# Altium schematic symbol library 1.4 - 74系列TTL芯片.SchLib: 650 symbols (part 7 of 7)
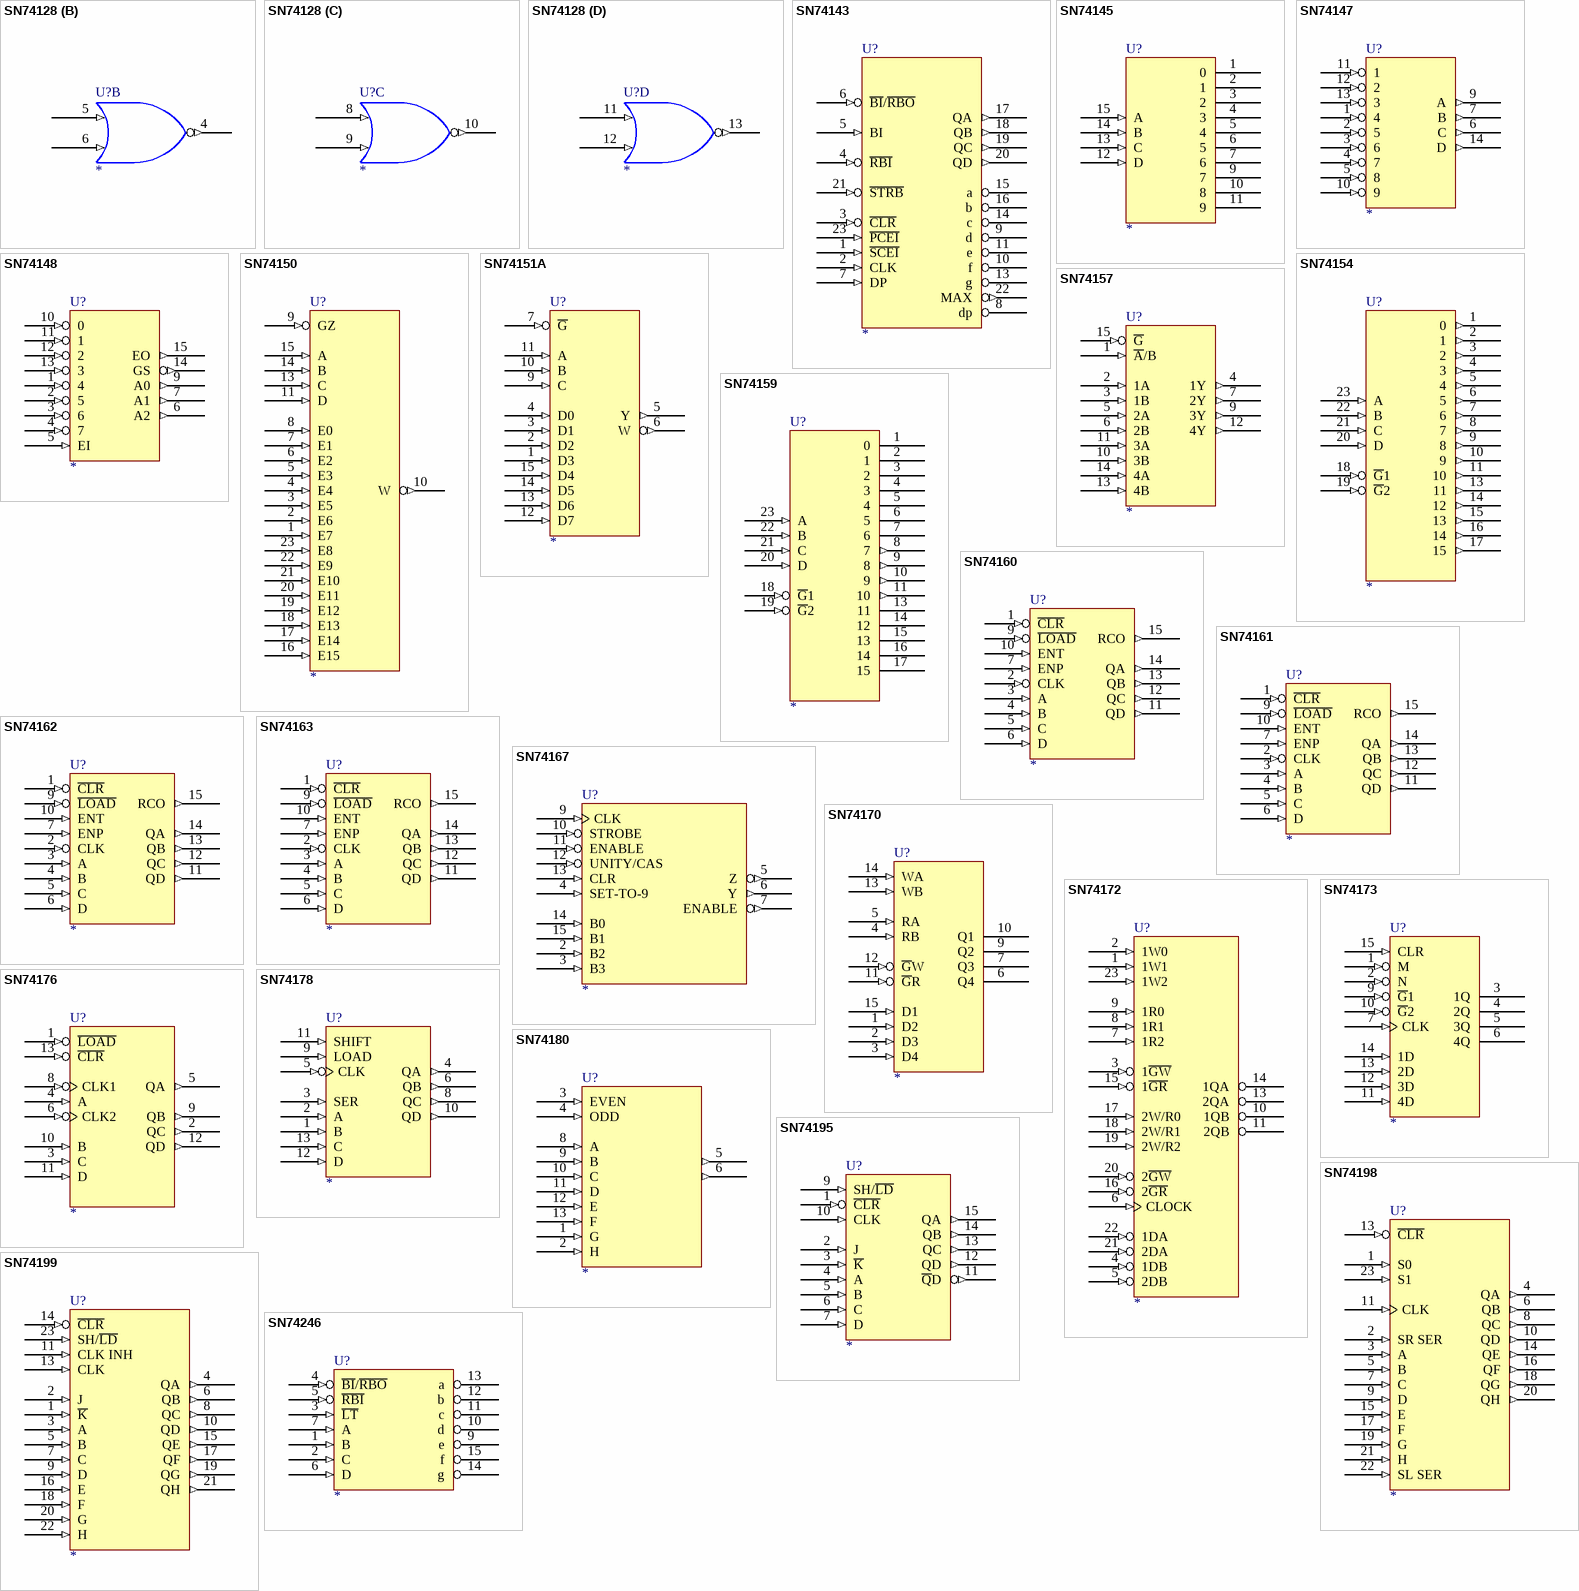
[diagram p36: symbols SN74128 to SN74246]

## SN74176
designator U?
35-MHZ DECADE BIN CNT/LCH RS; 技术支持，联系售后: 唯一出售店铺网址https://shop463601444.taobao.com
footprint DIP-14
pins: 1 ~{LOAD} (in), 2 QC (out), 3 C (in), 4 A (in), 5 QA (out), 6 CLK2 (in), 7 GND (power) hidden to GND, 8 CLK1 (in), 9 QB (out), 10 B (in), 11 D (in), 12 QD (out), 13 ~{CLR} (in), 14 VCC (power) hidden to VCC
1 alternate drawing of the same symbol

## SN74178
designator U?
4-BIT PARALLEL-ACCESS SFT REG; 技术支持，联系售后: 唯一出售店铺网址https://shop463601444.taobao.com
footprint DIP-14
pins: 1 B (in), 2 A (in), 3 SER (in), 4 QA (out), 5 CLK (in), 6 QB (out), 7 GND (power) hidden to GND, 8 QC (out), 9 LOAD (in), 10 QD (out), 11 SHIFT (in), 12 D (in), 13 C (in), 14 VCC (power) hidden to VCC
1 alternate drawing of the same symbol

## SN74180
designator U?
9-BIT PARITY GNR/CHKR; 技术支持，联系售后: 唯一出售店铺网址https://shop463601444.taobao.com
footprint DIP-14
pins: 1 G (in), 2 H (in), 3 EVEN (in), 4 ODD (in), 5 (out), 6 (out), 7 GND (power) hidden to GND, 8 A (in), 9 B (in), 10 C (in), 11 D (in), 12 E (in), 13 F (in), 14 VCC (power) hidden to VCC
1 alternate drawing of the same symbol

## SN74195
designator U?
4-BIT PARALLEL ACCESS SFT REG; 技术支持，联系售后: 唯一出售店铺网址https://shop463601444.taobao.com
footprint DIP-16
pins: 1 ~{CLR} (in), 2 J (in), 3 ~{K} (in), 4 A (in), 5 B (in), 6 C (in), 7 D (in), 8 GND (power) hidden to GND, 9 SH/~{LD} (in), 10 CLK (in), 11 ~{Q}D (out), 12 QD (out), 13 QC (out), 14 QB (out), 15 QA (out), 16 VCC (power) hidden to VCC
1 alternate drawing of the same symbol

## SN74198
designator U?
8-BIT SFT REG; 技术支持，联系售后: 唯一出售店铺网址https://shop463601444.taobao.com
footprint DIP-24
pins: 1 S0 (in), 2 SR SER (in), 3 A (in), 4 QA (out), 5 B (in), 6 QB (out), 7 C (in), 8 QC (out), 9 D (in), 10 QD (out), 11 CLK (in), 12 GND (power) hidden to GND, 13 ~{CLR} (in), 14 QE (out), 15 E (in), 16 QF (out), 17 F (in), 18 QG (out), 19 G (in), 20 QH (out), 21 H (in), 22 SL SER (in), 23 S1 (in), 24 VCC (power) hidden to VCC
1 alternate drawing of the same symbol

## SN74199
designator U?
8-BIT SFT REG; 技术支持，联系售后: 唯一出售店铺网址https://shop463601444.taobao.com
footprint DIP-24
pins: 1 ~{K} (in), 2 J (in), 3 A (in), 4 QA (out), 5 B (in), 6 QB (out), 7 C (in), 8 QC (out), 9 D (in), 10 QD (out), 11 CLK INH (in), 12 GND (power) hidden to GND, 13 CLK (in), 14 ~{CLR} (in), 15 QE (out), 16 E (in), 17 QF (out), 18 F (in), 19 QG (out), 20 G (in), 21 QH (out), 22 H (in), 23 SH/~{LD} (in), 24 VCC (power) hidden to VCC
1 alternate drawing of the same symbol

## SN74246
designator U?
BCD-TO-SEVEN-SEGMENTDEC/DRV; 技术支持，联系售后: 唯一出售店铺网址https://shop463601444.taobao.com
footprint DIP-16
footprint SO16
pins: 1 B (in), 2 C (in), 3 ~{LT} (in), 4 ~{BI}/~{RBO} (in), 5 ~{RBI} (in), 6 D (in), 7 A (in), 8 GND (power) hidden to GND, 9 e (oc), 10 d (oc), 11 c (oc), 12 b (oc), 13 a (oc), 14 g (oc), 15 f (oc), 16 VCC (power) hidden to VCC
1 alternate drawing of the same symbol

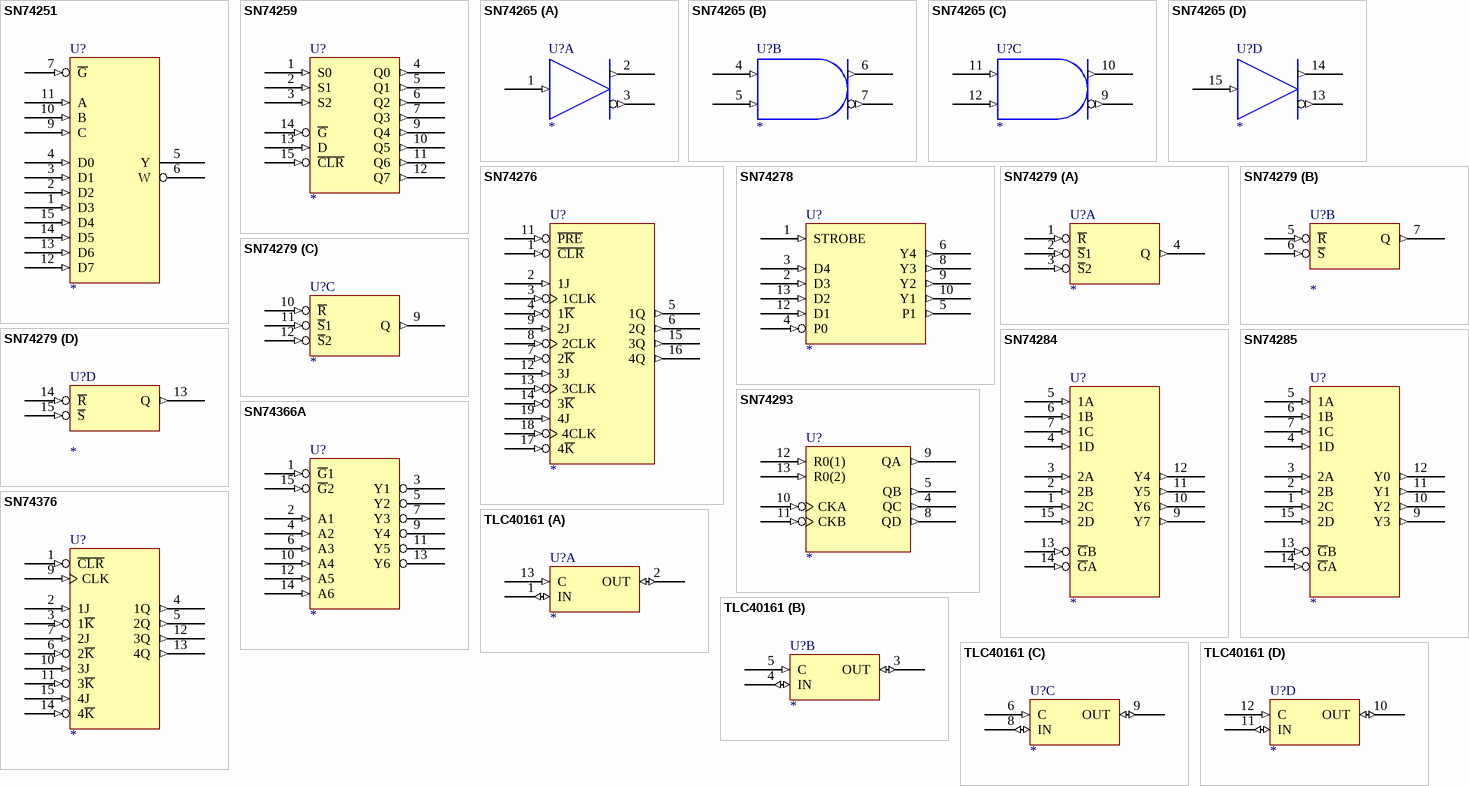
[diagram p30: symbols SN74251 to TLC40161]

## SN74251
designator U?
DATA SLCR/MUX 3SO; 技术支持，联系售后: 唯一出售店铺网址https://shop463601444.taobao.com
footprint DIP-16
footprint SO16
pins: 1 D3 (in), 2 D2 (in), 3 D1 (in), 4 D0 (in), 5 Y (hiz), 6 W (hiz), 7 ~{G} (in), 8 GND (power) hidden to GND, 9 C (in), 10 B (in), 11 A (in), 12 D7 (in), 13 D6 (in), 14 D5 (in), 15 D4 (in), 16 VCC (power) hidden to VCC
1 alternate drawing of the same symbol

## SN74259
designator U?
8-BIT ADDRESSABLE LCH; 技术支持，联系售后: 唯一出售店铺网址https://shop463601444.taobao.com
footprint DIP-16
footprint SO16
pins: 1 S0 (in), 2 S1 (in), 3 S2 (in), 4 Q0 (out), 5 Q1 (out), 6 Q2 (out), 7 Q3 (out), 8 GND (power) hidden to GND, 9 Q4 (out), 10 Q5 (out), 11 Q6 (out), 12 Q7 (out), 13 D (in), 14 ~{G} (in), 15 ~{CLR} (in), 16 VCC (power) hidden to VCC
1 alternate drawing of the same symbol

## SN74265
designator U?
QUAD COMPLEMENTARY-OUTPUT ELEMENTS; 技术支持，联系售后: 唯一出售店铺网址https://shop463601444.taobao.com
footprint DIP-16
part A pins: 1 (in), 2 (out), 3 (out), 8 GND (power) hidden to GND, 16 VCC (power) hidden to VCC
part B pins: 4 (in), 5 (in), 6 (out), 7 (out), 8 GND (power) hidden to GND, 16 VCC (power) hidden to VCC
part C pins: 8 GND (power) hidden to GND, 9 (out), 10 (out), 11 (in), 12 (in), 16 VCC (power) hidden to VCC
part D pins: 8 GND (power) hidden to GND, 13 (out), 14 (out), 15 (in), 16 VCC (power) hidden to VCC
2 alternate drawings of the same symbol

## SN74276
designator U?
QUAD JK FF; 技术支持，联系售后: 唯一出售店铺网址https://shop463601444.taobao.com
footprint DIP-20
pins: 1 ~{CLR} (in), 2 1J (in), 3 1CLK (in), 4 1~{K} (in), 5 1Q (out), 6 2Q (out), 7 2~{K} (in), 8 2CLK (in), 9 2J (in), 10 GND (power) hidden to GND, 11 ~{PRE} (in), 12 3J (in), 13 3CLK (in), 14 3~{K} (in), 15 3Q (out), 16 4Q (out), 17 4~{K} (in), 18 4CLK (in), 19 4J (in), 20 VCC (power) hidden to VCC
1 alternate drawing of the same symbol

## SN74278
designator U?
f4-BIT CASCADED PRIORITY REG; 技术支持，联系售后: 唯一出售店铺网址https://shop463601444.taobao.com
footprint DIP-14
pins: 1 STROBE (in), 2 D3 (in), 3 D4 (in), 4 P0 (in), 5 P1 (out), 6 Y4 (out), 7 GND (power) hidden to GND, 8 Y3 (out), 9 Y2 (out), 10 Y1 (out), 12 D1 (in), 13 D2 (in), 14 VCC (power) hidden to VCC
1 alternate drawing of the same symbol

## SN74279
designator U?
QUAD S\-R\ LCH; 技术支持，联系售后: 唯一出售店铺网址https://shop463601444.taobao.com
footprint DIP-16
footprint SO16
part A pins: 1 ~{R} (in), 2 ~{S}1 (in), 3 ~{S}2 (in), 4 Q (out), 8 GND (power) hidden to GND, 16 VCC (power) hidden to VCC
part B pins: 5 ~{R} (in), 6 ~{S} (in), 7 Q (out), 8 GND (power) hidden to GND, 16 VCC (power) hidden to VCC
part C pins: 8 GND (power) hidden to GND, 9 Q (out), 10 ~{R} (in), 11 ~{S}1 (in), 12 ~{S}2 (in), 16 VCC (power) hidden to VCC
part D pins: 8 GND (power) hidden to GND, 13 Q (out), 14 ~{R} (in), 15 ~{S} (in), 16 VCC (power) hidden to VCC
1 alternate drawing of the same symbol

## SN74284
designator U?
4-BIT BY 4-BIT PARALLEL BIN MULT; 技术支持，联系售后: 唯一出售店铺网址https://shop463601444.taobao.com
footprint DIP-16
pins: 1 2C (in), 2 2B (in), 3 2A (in), 4 1D (in), 5 1A (in), 6 1B (in), 7 1C (in), 8 GND (power) hidden to GND, 9 Y7 (out), 10 Y6 (out), 11 Y5 (out), 12 Y4 (out), 13 ~{G}B (in), 14 ~{G}A (in), 15 2D (in), 16 VCC (power) hidden to VCC
1 alternate drawing of the same symbol

## SN74285
designator U?
4-BIT BY 4-BIT PARALLEL BIN MULT; 技术支持，联系售后: 唯一出售店铺网址https://shop463601444.taobao.com
footprint DIP-16
pins: 1 2C (in), 2 2B (in), 3 2A (in), 4 1D (in), 5 1A (in), 6 1B (in), 7 1C (in), 8 GND (power) hidden to GND, 9 Y3 (out), 10 Y2 (out), 11 Y1 (out), 12 Y0 (out), 13 ~{G}B (in), 14 ~{G}A (in), 15 2D (in), 16 VCC (power) hidden to VCC
1 alternate drawing of the same symbol

## SN74293
designator U?
DECADE AND 4-BIT BIN CNT; 技术支持，联系售后: 唯一出售店铺网址https://shop463601444.taobao.com
footprint DIP-14
footprint SO14
pins: 4 QC (out), 5 QB (out), 7 GND (power) hidden to GND, 8 QD (out), 9 QA (out), 10 CKA (in), 11 CKB (in), 12 R0(1) (in), 13 R0(2) (in), 14 VCC (power) hidden to VCC
1 alternate drawing of the same symbol

## SN74366A
designator U?
HEX BUS DRV 3SO; 技术支持，联系售后: 唯一出售店铺网址https://shop463601444.taobao.com
footprint DIP-16
footprint SO16
pins: 1 ~{G}1 (in), 2 A1 (in), 3 Y1 (hiz), 4 A2 (in), 5 Y2 (hiz), 6 A3 (in), 7 Y3 (hiz), 8 GND (power) hidden to GND, 9 Y4 (hiz), 10 A4 (in), 11 Y5 (hiz), 12 A5 (in), 13 Y6 (hiz), 14 A6 (in), 15 ~{G}2 (in), 16 VCC (power) hidden to VCC
1 alternate drawing of the same symbol

## SN74376
designator U?
QUAD J-K\ FF; 技术支持，联系售后: 唯一出售店铺网址https://shop463601444.taobao.com
footprint DIP-16
pins: 1 ~{CLR} (in), 2 1J (in), 3 1~{K} (in), 4 1Q (out), 5 2Q (out), 6 2~{K} (in), 7 2J (in), 8 GND (power) hidden to GND, 9 CLK (in), 10 3J (in), 11 3~{K} (in), 12 3Q (out), 13 4Q (out), 14 4~{K} (in), 15 4J (in), 16 VCC (power) hidden to VCC
1 alternate drawing of the same symbol

## TLC40161
designator U?
QUAD ANALOG SWITCH MULTIPLEXER; 技术支持，联系售后: 唯一出售店铺网址https://shop463601444.taobao.com
footprint SO14
footprint DIP-14
part A pins: 1 IN (io), 2 OUT (io), 7 GND (power) hidden to GND, 13 C (in), 14 VCC (power) hidden to VCC
part B pins: 3 OUT (io), 4 IN (io), 5 C (in), 7 GND (power) hidden to GND, 14 VCC (power) hidden to VCC
part C pins: 6 C (in), 7 GND (power) hidden to GND, 8 IN (io), 9 OUT (io), 14 VCC (power) hidden to VCC
part D pins: 7 GND (power) hidden to GND, 10 OUT (io), 11 IN (io), 12 C (in), 14 VCC (power) hidden to VCC
1 alternate drawing of the same symbol